# Altium footprint library hphonglib.PcbLib: 703 footprints (part 38 of 44)
Each footprint in its own frame and in the unit in brackets; x right, y up, seen from the top. Pads: shape width x height; smd on the part's side, far side on the other; paste and mask are expansions set on the pad; w line width, h text height; cw(c..) or ccw(c..) is an arc to the next point about the centre after c.
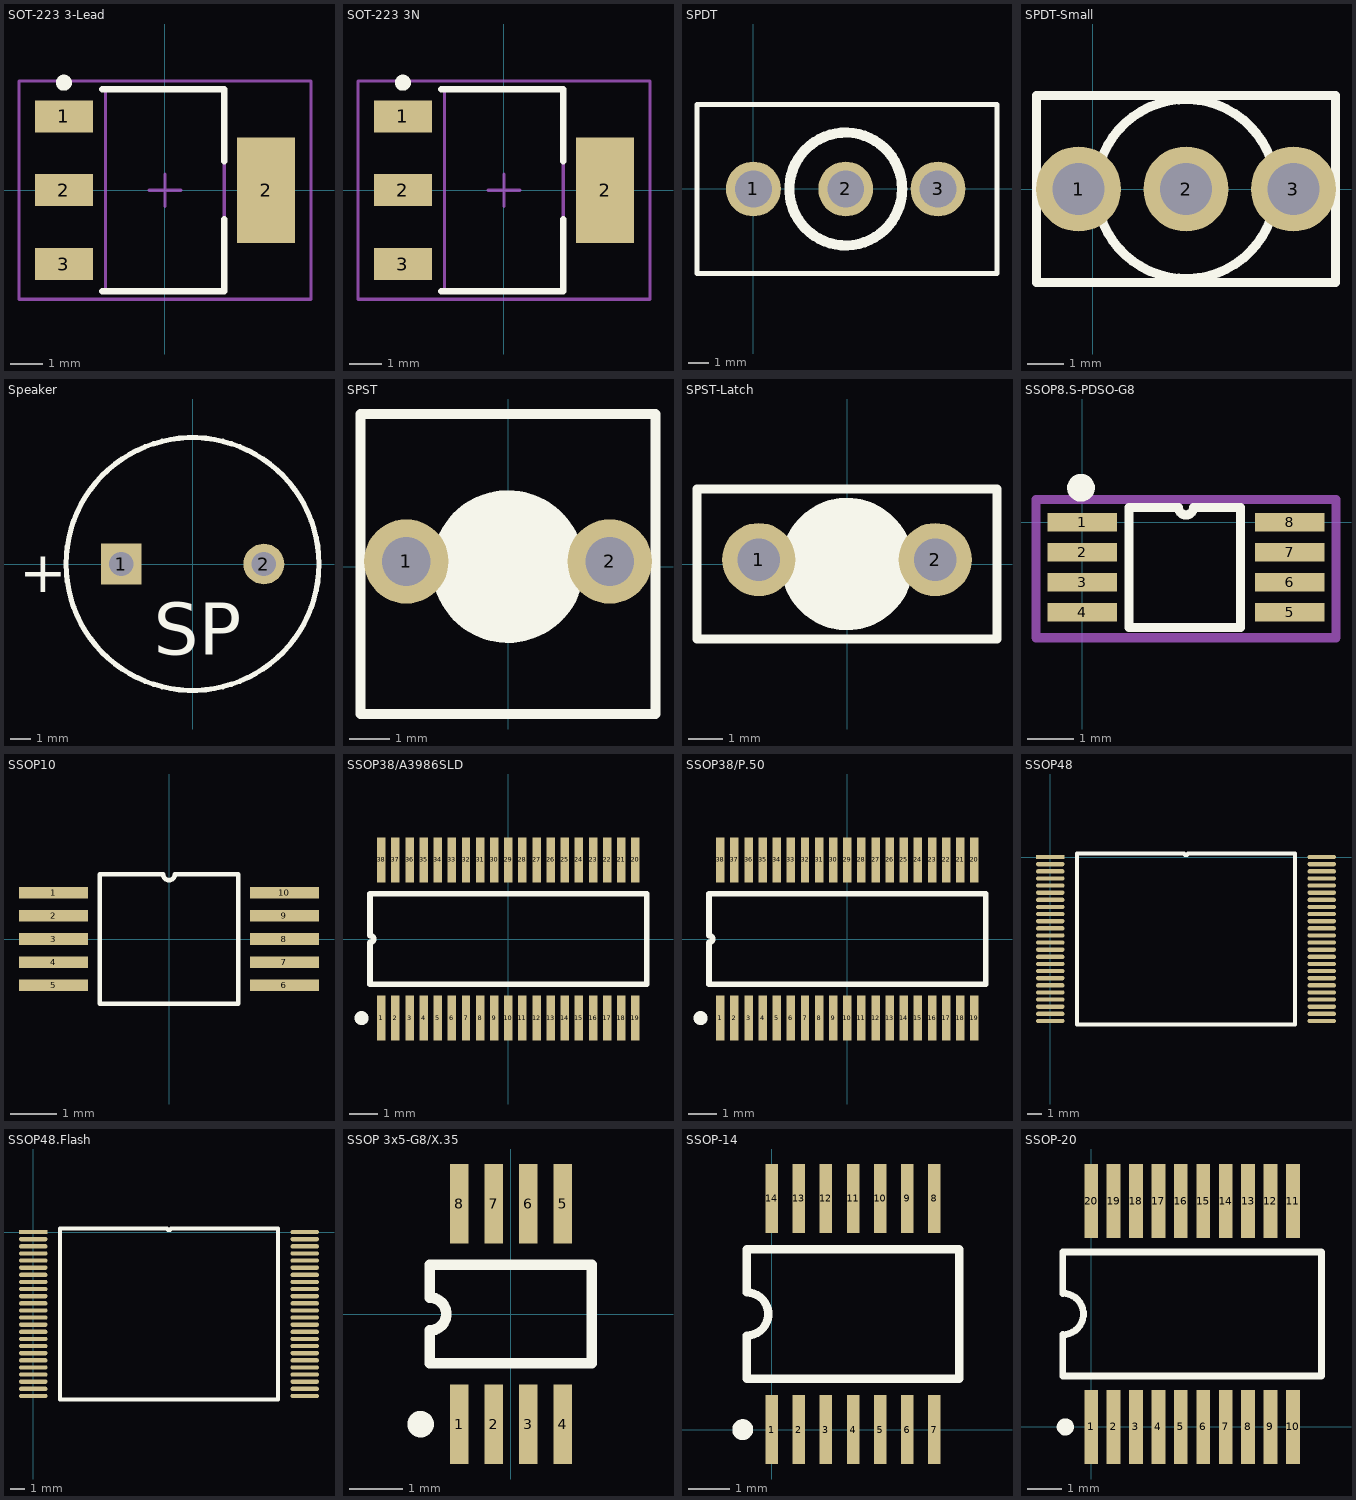
[diagram p37: the footprints below, top view; thin cyan lines are the x and y axes]

## SOT-223 3-Lead [mm]
height 1.8
pads (4):
  rect 1.8x1 smd: 1(-3.15,2.3) 2(-3.15,0) 3(-3.15,-2.3)
  rect 1.8x3.3 smd: 2(3.15,0)
Top Overlay:
  circle w0.25: c-3.15,3.35 r0.125
  lines w0.2: -1.95,-3.15 1.85,-3.15 1.85,-0.9 ; -1.95,3.15 1.85,3.15 1.85,0.9
Mechanical 13:
  lines w0.1: -1.85,-3.15 -1.85,3.15 1.85,3.15 1.85,-3.15 -1.85,-3.15
Mechanical 15:
  lines w0.1: -0.5,0 0.5,0 ; 0,-0.5 0,0.5 ; -4.55,-3.4 -4.55,3.4 4.55,3.4 4.55,-3.4 -4.55,-3.4
3D body: height 0.33, standoff 0.01, extent 1.825,-1.505 3.58,1.505
3D body: height 0.33, standoff 0.01, extent -3.56,-2.685 -1.8,-1.915
3D body: height 0.33, standoff 0.01, extent -3.56,-0.385 -1.8,0.385
3D body: height 0.33, standoff 0.01, extent -3.56,1.915 -1.8,2.685
3D body: height 1.75, standoff 0.1, extent -1.85,-3.15 1.85,3.15

## SOT-223 3N [mm]
height 1.8
pads (4):
  rect 1.8x1 smd: 1(-3.15,2.3) 2(-3.15,0) 3(-3.15,-2.3)
  rect 1.8x3.3 smd: 2(3.15,0)
Top Overlay:
  circle w0.25: c-3.15,3.35 r0.125
  lines w0.2: -1.95,-3.15 1.85,-3.15 1.85,-0.9 ; -1.95,3.15 1.85,3.15 1.85,0.9
Mechanical 13:
  lines w0.1: -1.85,-3.15 -1.85,3.15 1.85,3.15 1.85,-3.15 -1.85,-3.15
Mechanical 15:
  lines w0.1: -0.5,0 0.5,0 ; 0,-0.5 0,0.5 ; -4.55,-3.4 -4.55,3.4 4.55,3.4 4.55,-3.4 -4.55,-3.4
3D body: height 1.69, standoff 0.04, extent -3.525,-3.25 3.475,3.25

## SPDT [mil] "Single-Pole, Double-Throw Switch; Solder Pad 35mil"
pads (3):
  round 107 hole 72: 1(0,0) 2(180,0) 3(360,0)
Top Overlay:
  circle w20: c180,0 r110
  lines w10: -110,-165 475,-165 475,165 -110,165 -110,-165
3D body: height 1126.73, standoff -95, extent -70,-233.46 430,233.47

## SPDT-Small [mil] "Single-Pole, Double-Throw Switch, Small Type; Solder Pad 35mil"
pads (3):
  round 91 hole 56: 1(-15,0) 2(100,0) 3(215,0)
Top Overlay:
  circle w10: c100,0 r96
  lines w10: -60,-100 -60,100 260,100 260,-100 -60,-100

## Speaker [mm] "Speaker footprint"
pads (2):
  rect 2x2 hole 1.2: 1(-3.5,0)
  round 2 hole 1.2: 2(3.5,0)
Top Overlay:
  circle w0.254: c0,0 r6.2
  text "+" at -8.509,-1.397 h2.03
  text "SP" at -1.905,-4.445 h2.54
Bottom Overlay:
  circle w0.254: c-0.025,0 r6.228
3D body: height 10.02, standoff 10, extent -2.035,-2.035 2.035,2.035
3D body: height 10, standoff 1, extent -6.2,-6.2 6.2,6.2

## SPST [mil] "Single-Pole, Single-Throw Switch; 2 Leads; Solder Pad 35mil"
pads (2):
  round 83 hole 48: 1(-100,5) 2(100,5)
Top Overlay:
  circle w80: c0,0 r35
  lines w10: -145,-145 145,-145 145,150 -145,150 -145,-145

## SPST-Latch [mil] "Single-Pole, Single-Throw Switch; 2 Leads; Solder Pad 35mil"
pads (2):
  round 83 hole 48: 1(-100,5) 2(100,5)
Top Overlay:
  circle w80: c0,0 r35
  lines w10: -170,-85 170,-85 170,85 -170,85 -170,-85

## SSOP8.S-PDSO-G8 [mm]
pads (8):
  rect 1.5x0.4 smd: 1(0,0) 2(0,-0.65) 3(0,-1.3) 4(0,-1.95) 5(4.5,-1.95) 6(4.5,-1.3) 7(4.5,-0.65) 8(4.5,0)
Top Overlay:
  lines w0.2: 1.016,-2.275 3.429,-2.275 3.429,0.325 2.412,0.325 cw(c2.25,0.325) 2.088,0.325 1.016,0.325 1.016,-2.275
  lines w0.3: 0.125,0.75 cw(c-0.025,0.75) 0.124,0.767
Mechanical 13:
  lines w0.2: -1,-2.5 -1,0.5 5.5,0.5 5.5,-2.5 -1,-2.5
3D body: height 0.2, standoff 0, extent 3.75,-1.475 4.75,-1.125
3D body: height 0.2, standoff 0, extent 3.75,-0.825 4.75,-0.475
3D body: height 0.2, standoff 0, extent 3.75,-0.175 4.75,0.175
3D body: height 0.2, standoff 0, extent -0.25,-2.125 0.75,-1.775
3D body: height 0.2, standoff 0, extent -0.25,-1.475 0.75,-1.125
3D body: height 0.2, standoff 0, extent -0.25,-0.825 0.75,-0.475
3D body: height 0.2, standoff 0, extent 3.75,-2.125 4.75,-1.775
3D body: height 0.2, standoff 0, extent -0.25,-0.175 0.75,0.175
3D body: height 1.1, standoff 0, extent 0.75,-2.475 3.75,0.525
3D body: height 1.2, standoff 1.1, extent 1.044,-0.235 1.554,0.275

## SSOP10 [mm] "Shrink Small Outline; 10 Leads; Body Width 3 mm; Pitch 0.5 mm"
pads (10):
  rect 1.5x0.25 smd: 1(-2.5,1) 2(-2.5,0.5) 3(-2.5,0) 4(-2.5,-0.5) 5(-2.5,-1) 6(2.5,-1) 7(2.5,-0.5) 8(2.5,0) 9(2.5,0.5) 10(2.5,1)
Top Overlay:
  lines w0.1: -0.15,1.4 -1.5,1.4 -1.5,-1.4 1.5,-1.4 1.5,1.4 0.15,1.4 ; -0.125,1.4 ccw(c0,1.4) 0.125,1.4

## SSOP38/A3986SLD [mm] "Shrink Small Outline; 38 Leads; Body Width 4.4 mm; Pitch 0.5 mm"
height 1.2
pads (38):
  rect 0.3x1.6 smd: 1(-4.5,-2.8) 2(-4,-2.8) 3(-3.5,-2.8) 4(-3,-2.8) 5(-2.5,-2.8) 6(-2,-2.8) 7(-1.5,-2.8) 8(-1,-2.8) 9(-0.5,-2.8) 10(0,-2.8) 11(0.5,-2.8) 12(1,-2.8) 13(1.5,-2.8) 14(2,-2.8) 15(2.5,-2.8) 16(3,-2.8) 17(3.5,-2.8) 18(4,-2.8) 19(4.5,-2.8) 20(4.5,2.8) 21(4,2.8) 22(3.5,2.8) 23(3,2.8) 24(2.5,2.8) 25(2,2.8) 26(1.5,2.8) 27(1,2.8) 28(0.5,2.8) 29(0,2.8) 30(-0.5,2.8) 31(-1,2.8) 32(-1.5,2.8) 33(-2,2.8) 34(-2.5,2.8) 35(-3,2.8) 36(-3.5,2.8) 37(-4,2.8) 38(-4.5,2.8)
Top Overlay:
  circle w0.25: c-5.2,-2.8 r0.125
  lines w0.2: -4.9,-1.6 -4.9,-0.125 ccw(c-4.9,0) -4.9,0.125 -4.9,1.6 4.9,1.6 4.9,-1.6 -4.9,-1.6

## SSOP38/P.50 [mm] "Shrink Small Outline; 38 Leads; Body Width 4.4 mm; Pitch 0.5 mm"
height 1.2
pads (38):
  rect 0.3x1.6 smd: 1(-4.5,-2.8) 2(-4,-2.8) 3(-3.5,-2.8) 4(-3,-2.8) 5(-2.5,-2.8) 6(-2,-2.8) 7(-1.5,-2.8) 8(-1,-2.8) 9(-0.5,-2.8) 10(0,-2.8) 11(0.5,-2.8) 12(1,-2.8) 13(1.5,-2.8) 14(2,-2.8) 15(2.5,-2.8) 16(3,-2.8) 17(3.5,-2.8) 18(4,-2.8) 19(4.5,-2.8) 20(4.5,2.8) 21(4,2.8) 22(3.5,2.8) 23(3,2.8) 24(2.5,2.8) 25(2,2.8) 26(1.5,2.8) 27(1,2.8) 28(0.5,2.8) 29(0,2.8) 30(-0.5,2.8) 31(-1,2.8) 32(-1.5,2.8) 33(-2,2.8) 34(-2.5,2.8) 35(-3,2.8) 36(-3.5,2.8) 37(-4,2.8) 38(-4.5,2.8)
Top Overlay:
  circle w0.25: c-5.2,-2.8 r0.125
  lines w0.2: -4.9,-1.6 4.9,-1.6 4.9,1.6 -4.9,1.6 -4.9,0.125 cw(c-4.9,0) -4.9,-0.125 -4.9,-1.6

## SSOP48 [mil]
pads (48):
  rect 80x12.2 smd: 1(0,0)
  oval 80x12.2 smd: 2(0,-20) 3(0,-40) 4(0,-60) 5(0,-80) 6(0,-100) 7(0,-120) 8(0,-140) 9(0,-160) 10(0,-180) 11(0,-200) 12(0,-220) 13(0,-240) 14(0,-260) 15(0,-280) 16(0,-300) 17(0,-320) 18(0,-340) 19(0,-360) 20(0,-380) 21(0,-400) 22(0,-420) 23(0,-440) 24(0,-460) 25(762,-460) 26(762,-440) 27(762,-420) 28(762,-400) 29(762,-380) 30(762,-360) 31(762,-340) 32(762,-320) 33(762,-300) 34(762,-280) 35(762,-260) 36(762,-240) 37(762,-220) 38(762,-200) 39(762,-180) 40(762,-160) 41(762,-140) 42(762,-120) 43(762,-100) 44(762,-80) 45(762,-60) 46(762,-40) 47(762,-20) 48(762,0)
Top Overlay:
  lines w10: 75,-470 687,-470 687,10 386,10 cw(c381,10) 376,10 75,10 75,-470
3D body: height 3.94, standoff 0.2, extent -15,-405 15,-395
3D body: height 3.94, standoff 0.2, extent -15,-425 15,-415
3D body: height 3.94, standoff 0.2, extent -15,-465 15,-455
3D body: height 3.94, standoff 0.2, extent -15,-445 15,-435
3D body: height 3.94, standoff 0.2, extent -15,-325 15,-315
3D body: height 3.94, standoff 0.2, extent -15,-345 15,-335
3D body: height 3.94, standoff 0.2, extent -15,-385 15,-375
3D body: height 3.94, standoff 0.2, extent -15,-365 15,-355
3D body: height 3.94, standoff 0.2, extent -15,-245 15,-235
3D body: height 3.94, standoff 0.2, extent -15,-265 15,-255
3D body: height 3.94, standoff 0.2, extent -15,-305 15,-295
3D body: height 3.94, standoff 0.2, extent -15,-285 15,-275
3D body: height 3.94, standoff 0.2, extent -15,-165 15,-155
3D body: height 3.94, standoff 0.2, extent -15,-185 15,-175
3D body: height 3.94, standoff 0.2, extent -15,-225 15,-215
3D body: height 3.94, standoff 0.2, extent -15,-205 15,-195
3D body: height 3.94, standoff 0.2, extent -15,-85 15,-75
3D body: height 3.94, standoff 0.2, extent -15,-105 15,-95
3D body: height 3.94, standoff 0.2, extent -15,-145 15,-135
3D body: height 3.94, standoff 0.2, extent -15,-125 15,-115
3D body: height 3.94, standoff 0.2, extent -15,-45 15,-35
3D body: height 3.94, standoff 0.2, extent -15,-65 15,-55
3D body: height 3.94, standoff 0.2, extent -15,-25 15,-15
3D body: height 3.94, standoff 0.2, extent 745,-425 775,-415
3D body: height 3.94, standoff 0.2, extent 745,-445 775,-435
3D body: height 3.94, standoff 0.2, extent 745,-465 775,-455
3D body: height 3.94, standoff 0.2, extent 745,-365 775,-355
3D body: height 3.94, standoff 0.2, extent 745,-385 775,-375
3D body: height 3.94, standoff 0.2, extent 745,-405 775,-395
3D body: height 3.94, standoff 0.2, extent 745,-305 775,-295
3D body: height 3.94, standoff 0.2, extent 745,-325 775,-315
3D body: height 3.94, standoff 0.2, extent 745,-345 775,-335
3D body: height 3.94, standoff 0.2, extent 745,-245 775,-235
3D body: height 3.94, standoff 0.2, extent 745,-265 775,-255
3D body: height 3.94, standoff 0.2, extent 745,-285 775,-275
3D body: height 3.94, standoff 0.2, extent 745,-185 775,-175
3D body: height 3.94, standoff 0.2, extent 745,-205 775,-195
3D body: height 3.94, standoff 0.2, extent 745,-225 775,-215
3D body: height 3.94, standoff 0.2, extent 745,-125 775,-115
3D body: height 3.94, standoff 0.2, extent 745,-145 775,-135
3D body: height 3.94, standoff 0.2, extent 745,-165 775,-155
3D body: height 3.94, standoff 0.2, extent 745,-65 775,-55
3D body: height 3.94, standoff 0.2, extent 745,-85 775,-75
3D body: height 3.94, standoff 0.2, extent 745,-105 775,-95
3D body: height 3.94, standoff 0.2, extent 745,-45 775,-35
3D body: height 3.94, standoff 0.2, extent 745,-25 775,-15
3D body: height 3.94, standoff 0.2, extent -15,-5 15,5
3D body: height 3.94, standoff 0.2, extent 745,-5 775,5
3D body: height 47.24, standoff 1.97, extent 15,-470 745,10
3D body: height 47.64, standoff 46.85, extent 42.18,-46.96 72.77,-16.37

## SSOP48.Flash [mil]
pads (48):
  rect 80x12.2 smd: 1(0,0)
  oval 80x12.2 smd: 2(0,-20) 3(0,-40) 4(0,-60) 5(0,-80) 6(0,-100) 7(0,-120) 8(0,-140) 9(0,-160) 10(0,-180) 11(0,-200) 12(0,-220) 13(0,-240) 14(0,-260) 15(0,-280) 16(0,-300) 17(0,-320) 18(0,-340) 19(0,-360) 20(0,-380) 21(0,-400) 22(0,-420) 23(0,-440) 24(0,-460) 25(762,-460) 26(762,-440) 27(762,-420) 28(762,-400) 29(762,-380) 30(762,-360) 31(762,-340) 32(762,-320) 33(762,-300) 34(762,-280) 35(762,-260) 36(762,-240) 37(762,-220) 38(762,-200) 39(762,-180) 40(762,-160) 41(762,-140) 42(762,-120) 43(762,-100) 44(762,-80) 45(762,-60) 46(762,-40) 47(762,-20) 48(762,0)
Top Overlay:
  lines w10: 75,-470 687,-470 687,10 386,10 cw(c381,10) 376,10 75,10 75,-470
3D body: height 3.94, standoff 0.2, extent -15,-405 15,-395
3D body: height 3.94, standoff 0.2, extent -15,-425 15,-415
3D body: height 3.94, standoff 0.2, extent -15,-465 15,-455
3D body: height 3.94, standoff 0.2, extent -15,-445 15,-435
3D body: height 3.94, standoff 0.2, extent -15,-325 15,-315
3D body: height 3.94, standoff 0.2, extent -15,-345 15,-335
3D body: height 3.94, standoff 0.2, extent -15,-385 15,-375
3D body: height 3.94, standoff 0.2, extent -15,-365 15,-355
3D body: height 3.94, standoff 0.2, extent -15,-245 15,-235
3D body: height 3.94, standoff 0.2, extent -15,-265 15,-255
3D body: height 3.94, standoff 0.2, extent -15,-305 15,-295
3D body: height 3.94, standoff 0.2, extent -15,-285 15,-275
3D body: height 3.94, standoff 0.2, extent -15,-165 15,-155
3D body: height 3.94, standoff 0.2, extent -15,-185 15,-175
3D body: height 3.94, standoff 0.2, extent -15,-225 15,-215
3D body: height 3.94, standoff 0.2, extent -15,-205 15,-195
3D body: height 3.94, standoff 0.2, extent -15,-85 15,-75
3D body: height 3.94, standoff 0.2, extent -15,-105 15,-95
3D body: height 3.94, standoff 0.2, extent -15,-145 15,-135
3D body: height 3.94, standoff 0.2, extent -15,-125 15,-115
3D body: height 3.94, standoff 0.2, extent -15,-45 15,-35
3D body: height 3.94, standoff 0.2, extent -15,-65 15,-55
3D body: height 3.94, standoff 0.2, extent -15,-25 15,-15
3D body: height 3.94, standoff 0.2, extent 745,-425 775,-415
3D body: height 3.94, standoff 0.2, extent 745,-445 775,-435
3D body: height 3.94, standoff 0.2, extent 745,-465 775,-455
3D body: height 3.94, standoff 0.2, extent 745,-365 775,-355
3D body: height 3.94, standoff 0.2, extent 745,-385 775,-375
3D body: height 3.94, standoff 0.2, extent 745,-405 775,-395
3D body: height 3.94, standoff 0.2, extent 745,-305 775,-295
3D body: height 3.94, standoff 0.2, extent 745,-325 775,-315
3D body: height 3.94, standoff 0.2, extent 745,-345 775,-335
3D body: height 3.94, standoff 0.2, extent 745,-245 775,-235
3D body: height 3.94, standoff 0.2, extent 745,-265 775,-255
3D body: height 3.94, standoff 0.2, extent 745,-285 775,-275
3D body: height 3.94, standoff 0.2, extent 745,-185 775,-175
3D body: height 3.94, standoff 0.2, extent 745,-205 775,-195
3D body: height 3.94, standoff 0.2, extent 745,-225 775,-215
3D body: height 3.94, standoff 0.2, extent 745,-125 775,-115
3D body: height 3.94, standoff 0.2, extent 745,-145 775,-135
3D body: height 3.94, standoff 0.2, extent 745,-165 775,-155
3D body: height 3.94, standoff 0.2, extent 745,-65 775,-55
3D body: height 3.94, standoff 0.2, extent 745,-85 775,-75
3D body: height 3.94, standoff 0.2, extent 745,-105 775,-95
3D body: height 3.94, standoff 0.2, extent 745,-45 775,-35
3D body: height 3.94, standoff 0.2, extent 745,-25 775,-15
3D body: height 3.94, standoff 0.2, extent -15,-5 15,5
3D body: height 3.94, standoff 0.2, extent 745,-5 775,5
3D body: height 47.24, standoff 1.97, extent 15.75,-470.47 746.06,9.84
3D body: height 47.28, standoff 46.85, extent 42.18,-46.96 72.77,-16.37
3D body: height 47.28, standoff 46.85, extent 454.45,-317.06 504.08,-246.77
3D body: height 47.28, standoff 46.85, extent 394.5,-317.12 445.07,-246.85
3D body: height 47.28, standoff 46.85, extent 284.17,-317.06 314.17,-246.77
3D body: height 47.28, standoff 46.85, extent 482.99,-218.9 533.74,-148.23
3D body: height 47.28, standoff 46.85, extent 422.84,-218.78 473.7,-148.44
3D body: height 47.28, standoff 46.85, extent 302.87,-218.9 353.62,-148.35
3D body: height 47.28, standoff 46.85, extent 242.83,-218.78 293.58,-148.23
3D body: height 47.28, standoff 46.85, extent 363.05,-218.9 413.66,-148.23
3D body: height 47.28, standoff 46.85, extent 334.51,-317.21 385.04,-246.77

## SSOP 3x5-G8/X.35 [mm] "Shrink Small Outline; 8 Leads; Body Width 3 mm; Pitch 0.65 mm"
pads (8):
  rect 0.35x1.5 smd: 1(-0.975,-2.075) 2(-0.325,-2.075) 3(0.325,-2.075) 4(0.975,-2.075) 5(0.975,2.075) 6(0.325,2.075) 7(-0.325,2.075) 8(-0.975,2.075)
Top Overlay:
  circle w0.25: c-1.7,-2.075 r0.125
  lines w0.2: -1.525,-0.925 1.525,-0.925 1.525,0.925 -1.525,0.925 -1.525,0.308 cw(c-1.525,0) -1.525,-0.308 -1.525,-0.925

## SSOP-14 [mm] "Shrink Small Outline, Plastic, Thin; 14 Leads; Body Width 4.4 mm; Pitch 0.65 mm"
height 1.1
pads (14):
  rect 0.3x1.65 smd: 1(0,0) 2(0.65,0) 3(1.3,0) 4(1.95,0) 5(2.6,0) 6(3.25,0) 7(3.9,0) 8(3.9,5.55) 9(3.25,5.55) 10(2.6,5.55) 11(1.95,5.55) 12(1.3,5.55) 13(0.65,5.55) 14(0,5.55)
Top Overlay:
  circle w0.25: c-0.7,0 r0.125
  lines w0.2: -0.6,1.225 4.5,1.225 4.5,4.325 -0.6,4.325 -0.6,3.292 cw(c-0.6,2.775) -0.6,2.258 -0.6,1.225

## SSOP-20 [mm] "SSOP, Plastic; 20 Leads; Body Width 5.3 mm; Pitch 0.65 mm"
height 1.99
pads (20):
  rect 0.4x2.15 smd: 1(0,0) 2(0.65,0) 3(1.3,0) 4(1.95,0) 5(2.6,0) 6(3.25,0) 7(3.9,0) 8(4.55,0) 9(5.2,0) 10(5.85,0) 11(5.85,6.55) 12(5.2,6.55) 13(4.55,6.55) 14(3.9,6.55) 15(3.25,6.55) 16(2.6,6.55) 17(1.95,6.55) 18(1.3,6.55) 19(0.65,6.55) 20(0,6.55)
Top Overlay:
  circle w0.25: c-0.75,0 r0.125
  lines w0.2: -0.825,1.475 -0.825,2.675 ccw(c-0.825,3.275) -0.825,3.875 -0.825,5.075 6.675,5.075 6.675,1.475 -0.825,1.475
3D body: height 1.79, standoff -0.05, extent -0.75,-0.675 6.55,7.225